# Altium footprint library Molex FFC - FPC Connectors (SMT).PcbLib: 638 footprints (part 38 of 40)
Each footprint in its own frame and in the unit in brackets; x right, y up, seen from the top. Pads: shape width x height; smd on the part's side, far side on the other; paste and mask are expansions set on the pad; w line width, h text height; cw(c..) or ccw(c..) is an arc to the next point about the centre after c.
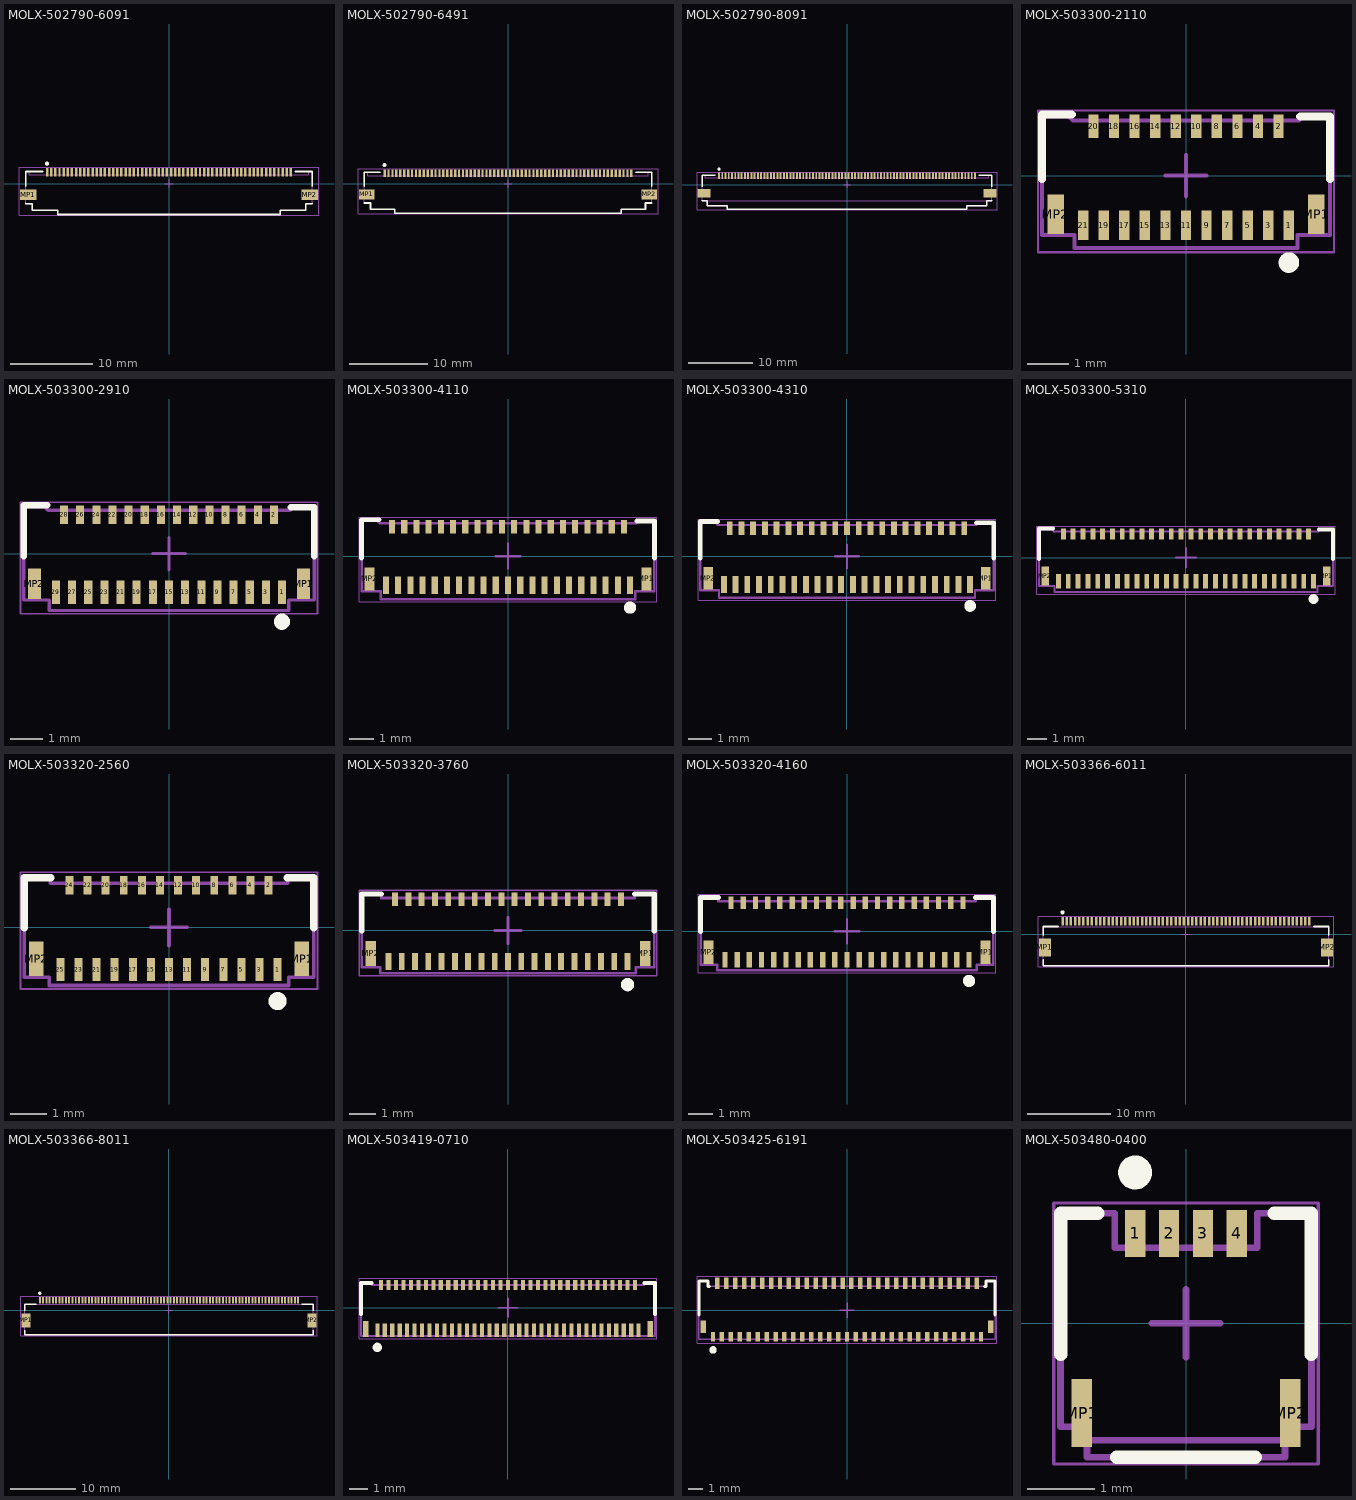
[diagram p37: the footprints below, top view; thin cyan lines are the x and y axes]

## MOLX-502790-6091 [mm] "FPC Connector, 60-Leads, Right Angle, Pitch 0.5 mm, Mated Height 2.5 mm, SMT"
height 2.512
pads (62):
  rect 0.3x1 smd: 1(-14.75,1.35) 2(-14.25,1.35) 3(-13.75,1.35) 4(-13.25,1.35) 5(-12.75,1.35) 6(-12.25,1.35) 7(-11.75,1.35) 8(-11.25,1.35) 9(-10.75,1.35) 10(-10.25,1.35) 11(-9.75,1.35) 12(-9.25,1.35) 13(-8.75,1.35) 14(-8.25,1.35) 15(-7.75,1.35) 16(-7.25,1.35) 17(-6.75,1.35) 18(-6.25,1.35) 19(-5.75,1.35) 20(-5.25,1.35) 21(-4.75,1.35) 22(-4.25,1.35) 23(-3.75,1.35) 24(-3.25,1.35) 25(-2.75,1.35) 26(-2.25,1.35) 27(-1.75,1.35) 28(-1.25,1.35) 29(-0.75,1.35) 30(-0.25,1.35) 31(0.25,1.35) 32(0.75,1.35) 33(1.25,1.35) 34(1.75,1.35) 35(2.25,1.35) 36(2.75,1.35) 37(3.25,1.35) 38(3.75,1.35) 39(4.25,1.35) 40(4.75,1.35) 41(5.25,1.35) 42(5.75,1.35) 43(6.25,1.35) 44(6.75,1.35) 45(7.25,1.35) 46(7.75,1.35) 47(8.25,1.35) 48(8.75,1.35) 49(9.25,1.35) 50(9.75,1.35) 51(10.25,1.35) 52(10.75,1.35) 53(11.25,1.35) 54(11.75,1.35) 55(12.25,1.35) 56(12.75,1.35) 57(13.25,1.35) 58(13.75,1.35) 59(14.25,1.35) 60(14.75,1.35)
  rect 2x1.3 smd: MP1(-17.05,-1.35) MP2(17.05,-1.35)
Top Overlay:
  circle w0.25: c-14.75,2.4 r0.125
  lines w0.2: -17.35,-2.4 -17.35,-2.45 -16.55,-2.45 -16.55,-3.25 -13.45,-3.25 -13.45,-3.75 13.45,-3.75 13.45,-3.25 16.55,-3.25 16.55,-2.45 17.35,-2.45 17.35,-2.4 ; -17.35,-0.3 -17.35,1.45 -15.3,1.45 ; 15.3,1.45 17.35,1.45 17.35,-0.3
Mechanical 13:
  lines w0.1: -17.35,-2.45 -16.55,-2.45 -16.55,-3.25 -13.45,-3.25 -13.45,-3.75 13.45,-3.75 13.45,-3.25 16.55,-3.25 16.55,-2.45 17.35,-2.45 17.35,1.45 16.9,1.45 16.9,1.05 -16.9,1.05 -16.9,1.45 -17.35,1.45 -17.35,-2.45
Mechanical 15:
  lines w0.05: -18.15,-3.85 -18.15,1.95 18.15,1.95 18.15,-3.85 -18.15,-3.85
  lines w0.1: -0.5,0 0.5,0 ; 0,-0.5 0,0.5
3D body: height 0.25, standoff 0, extent -17.75,-3.75 17.75,1.55

## MOLX-502790-6491 [mm] "FPC Connector, 64-Leads, Right Angle, Pitch 0.5 mm, Mated Height 2.5 mm, SMT"
height 2.512
pads (66):
  rect 0.3x1 smd: 1(-15.75,1.35) 2(-15.25,1.35) 3(-14.75,1.35) 4(-14.25,1.35) 5(-13.75,1.35) 6(-13.25,1.35) 7(-12.75,1.35) 8(-12.25,1.35) 9(-11.75,1.35) 10(-11.25,1.35) 11(-10.75,1.35) 12(-10.25,1.35) 13(-9.75,1.35) 14(-9.25,1.35) 15(-8.75,1.35) 16(-8.25,1.35) 17(-7.75,1.35) 18(-7.25,1.35) 19(-6.75,1.35) 20(-6.25,1.35) 21(-5.75,1.35) 22(-5.25,1.35) 23(-4.75,1.35) 24(-4.25,1.35) 25(-3.75,1.35) 26(-3.25,1.35) 27(-2.75,1.35) 28(-2.25,1.35) 29(-1.75,1.35) 30(-1.25,1.35) 31(-0.75,1.35) 32(-0.25,1.35) 33(0.25,1.35) 34(0.75,1.35) 35(1.25,1.35) 36(1.75,1.35) 37(2.25,1.35) 38(2.75,1.35) 39(3.25,1.35) 40(3.75,1.35) 41(4.25,1.35) 42(4.75,1.35) 43(5.25,1.35) 44(5.75,1.35) 45(6.25,1.35) 46(6.75,1.35) 47(7.25,1.35) 48(7.75,1.35) 49(8.25,1.35) 50(8.75,1.35) 51(9.25,1.35) 52(9.75,1.35) 53(10.25,1.35) 54(10.75,1.35) 55(11.25,1.35) 56(11.75,1.35) 57(12.25,1.35) 58(12.75,1.35) 59(13.25,1.35) 60(13.75,1.35) 61(14.25,1.35) 62(14.75,1.35) 63(15.25,1.35) 64(15.75,1.35)
  rect 2x1.3 smd: MP1(-18.05,-1.35) MP2(18.05,-1.35)
Top Overlay:
  circle w0.25: c-15.75,2.4 r0.125
  lines w0.2: -18.35,-2.4 -18.35,-2.45 -17.55,-2.45 -17.55,-3.25 -14.45,-3.25 -14.45,-3.75 14.45,-3.75 14.45,-3.25 17.55,-3.25 17.55,-2.45 18.35,-2.45 18.35,-2.4 ; -18.35,-0.3 -18.35,1.45 -16.3,1.45 ; 16.3,1.45 18.35,1.45 18.35,-0.3
Mechanical 13:
  lines w0.1: -17.9,1.05 -17.9,1.45 -18.35,1.45 -18.35,-2.45 -17.55,-2.45 -17.55,-3.25 -14.45,-3.25 -14.45,-3.75 14.45,-3.75 14.45,-3.25 17.55,-3.25 17.55,-2.45 18.35,-2.45 18.35,1.45 17.9,1.45 17.9,1.05 -17.9,1.05
Mechanical 15:
  lines w0.05: -19.15,-3.85 19.15,-3.85 19.15,1.95 -19.15,1.95 -19.15,-3.85
  lines w0.1: -0.5,0 0.5,0 ; 0,-0.5 0,0.5
3D body: height 0.25, standoff 0, extent -18.75,-3.75 18.75,1.55

## MOLX-502790-8091 [mm] "FPC Connector, 80-Leads, Right Angle, Pitch 0.5 mm, Mated Height 2.5 mm, SMT"
height 2.5
pads (82):
  rect 0.3x1 smd: 1(-19.75,1.35) 2(-19.25,1.35) 3(-18.75,1.35) 4(-18.25,1.35) 5(-17.75,1.35) 6(-17.25,1.35) 7(-16.75,1.35) 8(-16.25,1.35) 9(-15.75,1.35) 10(-15.25,1.35) 11(-14.75,1.35) 12(-14.25,1.35) 13(-13.75,1.35) 14(-13.25,1.35) 15(-12.75,1.35) 16(-12.25,1.35) 17(-11.75,1.35) 18(-11.25,1.35) 19(-10.75,1.35) 20(-10.25,1.35) 21(-9.75,1.35) 22(-9.25,1.35) 23(-8.75,1.35) 24(-8.25,1.35) 25(-7.75,1.35) 26(-7.25,1.35) 27(-6.75,1.35) 28(-6.25,1.35) 29(-5.75,1.35) 30(-5.25,1.35) 31(-4.75,1.35) 32(-4.25,1.35) 33(-3.75,1.35) 34(-3.25,1.35) 35(-2.75,1.35) 36(-2.25,1.35) 37(-1.75,1.35) 38(-1.25,1.35) 39(-0.75,1.35) 40(-0.25,1.35) 41(0.25,1.35) 42(0.75,1.35) 43(1.25,1.35) 44(1.75,1.35) 45(2.25,1.35) 46(2.75,1.35) 47(3.25,1.35) 48(3.75,1.35) 49(4.25,1.35) 50(4.75,1.35) 51(5.25,1.35) 52(5.75,1.35) 53(6.25,1.35) 54(6.75,1.35) 55(7.25,1.35) 56(7.75,1.35) 57(8.25,1.35) 58(8.75,1.35) 59(9.25,1.35) 60(9.75,1.35) 61(10.25,1.35) 62(10.75,1.35) 63(11.25,1.35) 64(11.75,1.35) 65(12.25,1.35) 66(12.75,1.35) 67(13.25,1.35) 68(13.75,1.35) 69(14.25,1.35) 70(14.75,1.35) 71(15.25,1.35) 72(15.75,1.35) 73(16.25,1.35) 74(16.75,1.35) 75(17.25,1.35) 76(17.75,1.35) 77(18.25,1.35) 78(18.75,1.35) 79(19.25,1.35) 80(19.75,1.35)
  rect 2x1.3 smd: MP1(-22.05,-1.35) MP2(22.05,-1.35)
Top Overlay:
  circle w0.25: c-19.75,2.4 r0.125
  lines w0.2: -22.35,-2.4 -22.35,-2.45 -21.55,-2.45 -21.55,-3.25 -18.45,-3.25 -18.45,-3.75 18.45,-3.75 18.45,-3.25 21.55,-3.25 21.55,-2.45 22.35,-2.45 22.35,-2.4 ; -22.35,-0.3 -22.35,1.45 -20.3,1.45 ; 20.3,1.45 22.35,1.45 22.35,-0.3
Mechanical 13:
  lines w0.1: -21.55,-2.45 -21.55,-3.25 -18.45,-3.25 -18.45,-3.75 18.45,-3.75 18.45,-3.25 21.55,-3.25 21.55,-2.45 ; -22.35,-2.45 -22.35,1.45 -21.9,1.45 -21.9,1.05 21.9,1.05 21.9,1.45 22.35,1.45 22.35,-2.45 -22.35,-2.45
Mechanical 15:
  lines w0.05: -23.15,-3.85 23.15,-3.85 23.15,1.95 -23.15,1.95 -23.15,-3.85
  lines w0.1: -0.5,0 0.5,0 ; 0,-0.5 0,0.5
3D body: height 0.25, standoff 0, extent -22.75,-3.75 22.75,1.55

## MOLX-503300-2110 [mm] "FPC Connector, 21-Leads, Right Angle, Pitch 0.25 mm, Mated Height 1.2 mm, SMT"
height 1.212
pads (23):
  rect 0.25x0.72 smd: 1(2.5,-1.202) 3(2,-1.202) 5(1.5,-1.202) 7(1,-1.202) 9(0.5,-1.202) 11(0,-1.202) 13(-0.5,-1.202) 15(-1,-1.202) 17(-1.5,-1.202) 19(-2,-1.202) 21(-2.5,-1.202)
  rect 0.25x0.57 smd: 2(2.25,1.203) 4(1.75,1.203) 6(1.25,1.203) 8(0.75,1.203) 10(0.25,1.203) 12(-0.25,1.203) 14(-0.75,1.203) 16(-1.25,1.203) 18(-1.75,1.203) 20(-2.25,1.203)
  rect 0.4x0.95 smd: MP1(3.17,-0.937) MP2(-3.17,-0.937)
Top Overlay:
  circle w0.25: c2.5,-2.112 r0.125
  lines w0.2: -3.5,-0.084 -3.5,1.488 -2.775,1.488 ; 2.775,1.438 3.5,1.438 3.5,-0.084
Mechanical 13:
  lines w0.1: -3.5,-1.442 -2.71,-1.442 -2.71,-1.762 2.71,-1.762 2.71,-1.442 3.5,-1.442 3.5,1.438 2.85,1.438 2.75,1.338 -2.75,1.338 -2.85,1.438 -3.5,1.438 -3.5,-1.442
Mechanical 15:
  lines w0.05: -3.6,-1.862 3.6,-1.862 3.6,1.587 -3.6,1.587 -3.6,-1.862
  lines w0.1: -0.5,0 0.5,0 ; 0,-0.5 0,0.5
3D body: height 0.25, standoff 0, extent -3.5,-1.762 3.5,1.438

## MOLX-503300-2910 [mm] "FPC Connector, 29-Leads, Right Angle, Pitch 0.25 mm, Mated Height 1.2 mm, SMT"
height 1.212
pads (31):
  rect 0.25x0.72 smd: 1(3.5,-1.202) 3(3,-1.202) 5(2.5,-1.202) 7(2,-1.202) 9(1.5,-1.202) 11(1,-1.202) 13(0.5,-1.202) 15(0,-1.202) 17(-0.5,-1.202) 19(-1,-1.202) 21(-1.5,-1.202) 23(-2,-1.202) 25(-2.5,-1.202) 27(-3,-1.202) 29(-3.5,-1.202)
  rect 0.25x0.57 smd: 2(3.25,1.203) 4(2.75,1.203) 6(2.25,1.203) 8(1.75,1.203) 10(1.25,1.203) 12(0.75,1.203) 14(0.25,1.203) 16(-0.25,1.203) 18(-0.75,1.203) 20(-1.25,1.203) 22(-1.75,1.203) 24(-2.25,1.203) 26(-2.75,1.203) 28(-3.25,1.203)
  rect 0.4x0.95 smd: MP1(4.17,-0.937) MP2(-4.17,-0.937)
Top Overlay:
  circle w0.25: c3.5,-2.112 r0.125
  lines w0.2: -4.5,-0.084 -4.5,1.488 -3.775,1.488 ; 3.775,1.438 4.5,1.438 4.5,-0.084
Mechanical 13:
  lines w0.1: -4.5,-1.442 -3.71,-1.442 -3.71,-1.762 3.71,-1.762 3.71,-1.442 4.5,-1.442 4.5,1.438 3.85,1.438 3.75,1.338 -3.75,1.338 -3.85,1.438 -4.5,1.438 -4.5,-1.442
Mechanical 15:
  lines w0.05: -4.6,-1.862 4.6,-1.862 4.6,1.587 -4.6,1.587 -4.6,-1.862
  lines w0.1: -0.5,0 0.5,0 ; 0,-0.5 0,0.5
3D body: height 0.25, standoff 0, extent -4.5,-1.762 4.5,1.438

## MOLX-503300-4110 [mm] "FPC Connector, 41-Leads, Right Angle, Pitch 0.25 mm, Mated Height 1.2 mm, SMT"
height 1.212
pads (43):
  rect 0.25x0.72 smd: 1(5,-1.202) 3(4.5,-1.202) 5(4,-1.202) 7(3.5,-1.202) 9(3,-1.202) 11(2.5,-1.202) 13(2,-1.202) 15(1.5,-1.202) 17(1,-1.202) 19(0.5,-1.202) 21(0,-1.202) 23(-0.5,-1.202) 25(-1,-1.202) 27(-1.5,-1.202) 29(-2,-1.202) 31(-2.5,-1.202) 33(-3,-1.202) 35(-3.5,-1.202) 37(-4,-1.202) 39(-4.5,-1.202) 41(-5,-1.202)
  rect 0.25x0.57 smd: 2(4.75,1.202) 4(4.25,1.202) 6(3.75,1.202) 8(3.25,1.202) 10(2.75,1.202) 12(2.25,1.202) 14(1.75,1.202) 16(1.25,1.202) 18(0.75,1.202) 20(0.25,1.202) 22(-0.25,1.202) 24(-0.75,1.202) 26(-1.25,1.202) 28(-1.75,1.202) 30(-2.25,1.202) 32(-2.75,1.202) 34(-3.25,1.202) 36(-3.75,1.202) 38(-4.25,1.202) 40(-4.75,1.202)
  rect 0.4x0.95 smd: MP1(5.67,-0.937) MP2(-5.67,-0.937)
Top Overlay:
  circle w0.25: c5,-2.113 r0.125
  lines w0.2: -6,-0.085 -6,1.488 -5.275,1.488 ; 5.275,1.438 6,1.438 6,-0.085
Mechanical 13:
  lines w0.1: -6,-1.442 -5.21,-1.442 -5.21,-1.762 5.21,-1.762 5.21,-1.442 6,-1.442 6,1.438 5.35,1.438 5.25,1.338 -5.25,1.338 -5.35,1.438 -6,1.438 -6,-1.442
Mechanical 15:
  lines w0.05: -6.1,-1.862 6.1,-1.862 6.1,1.587 -6.1,1.587 -6.1,-1.862
  lines w0.1: -0.5,0 0.5,0 ; 0,-0.5 0,0.5
3D body: height 0.25, standoff 0, extent -6,-1.762 6,1.438

## MOLX-503300-4310 [mm] "FPC Connector, 43-Leads, Right Angle, Pitch 0.25 mm, Mated Height 1.2 mm, SMT"
height 1.212
pads (45):
  rect 0.25x0.72 smd: 1(5.25,-1.202) 3(4.75,-1.202) 5(4.25,-1.202) 7(3.75,-1.202) 9(3.25,-1.202) 11(2.75,-1.202) 13(2.25,-1.202) 15(1.75,-1.202) 17(1.25,-1.202) 19(0.75,-1.202) 21(0.25,-1.202) 23(-0.25,-1.202) 25(-0.75,-1.202) 27(-1.25,-1.202) 29(-1.75,-1.202) 31(-2.25,-1.202) 33(-2.75,-1.202) 35(-3.25,-1.202) 37(-3.75,-1.202) 39(-4.25,-1.202) 41(-4.75,-1.202) 43(-5.25,-1.202)
  rect 0.25x0.57 smd: 2(5,1.202) 4(4.5,1.202) 6(4,1.202) 8(3.5,1.202) 10(3,1.202) 12(2.5,1.202) 14(2,1.202) 16(1.5,1.202) 18(1,1.202) 20(0.5,1.202) 22(0,1.202) 24(-0.5,1.202) 26(-1,1.202) 28(-1.5,1.202) 30(-2,1.202) 32(-2.5,1.202) 34(-3,1.202) 36(-3.5,1.202) 38(-4,1.202) 40(-4.5,1.202) 42(-5,1.202)
  rect 0.4x0.95 smd: MP1(5.92,-0.937) MP2(-5.92,-0.937)
Top Overlay:
  circle w0.25: c5.25,-2.113 r0.125
  lines w0.2: -6.25,-0.085 -6.25,1.488 -5.525,1.488 ; 5.525,1.438 6.25,1.438 6.25,-0.085
Mechanical 13:
  lines w0.1: -6.25,-1.442 -5.46,-1.442 -5.46,-1.762 5.46,-1.762 5.46,-1.442 6.25,-1.442 6.25,1.438 5.6,1.438 5.5,1.338 -5.5,1.338 -5.6,1.438 -6.25,1.438 -6.25,-1.442
Mechanical 15:
  lines w0.05: -6.35,-1.862 -6.35,1.587 6.35,1.587 6.35,-1.862 -6.35,-1.862
  lines w0.1: -0.5,0 0.5,0 ; 0,-0.5 0,0.5
3D body: height 0.25, standoff 0, extent -6.25,-1.762 6.25,1.438

## MOLX-503300-5310 [mm] "FPC Connector, 53-Leads, Right Angle, Pitch 0.25 mm, Mated Height 1.2 mm, SMT"
height 1.212
pads (55):
  rect 0.25x0.72 smd: 1(6.5,-1.202) 3(6,-1.202) 5(5.5,-1.202) 7(5,-1.202) 9(4.5,-1.202) 11(4,-1.202) 13(3.5,-1.202) 15(3,-1.202) 17(2.5,-1.202) 19(2,-1.202) 21(1.5,-1.202) 23(1,-1.202) 25(0.5,-1.202) 27(0,-1.202) 29(-0.5,-1.202) 31(-1,-1.202) 33(-1.5,-1.202) 35(-2,-1.202) 37(-2.5,-1.202) 39(-3,-1.202) 41(-3.5,-1.202) 43(-4,-1.202) 45(-4.5,-1.202) 47(-5,-1.202) 49(-5.5,-1.202) 51(-6,-1.202) 53(-6.5,-1.202)
  rect 0.25x0.57 smd: 2(6.25,1.202) 4(5.75,1.202) 6(5.25,1.202) 8(4.75,1.202) 10(4.25,1.202) 12(3.75,1.202) 14(3.25,1.202) 16(2.75,1.202) 18(2.25,1.202) 20(1.75,1.202) 22(1.25,1.202) 24(0.75,1.202) 26(0.25,1.202) 28(-0.25,1.202) 30(-0.75,1.202) 32(-1.25,1.202) 34(-1.75,1.202) 36(-2.25,1.202) 38(-2.75,1.202) 40(-3.25,1.202) 42(-3.75,1.202) 44(-4.25,1.202) 46(-4.75,1.202) 48(-5.25,1.202) 50(-5.75,1.202) 52(-6.25,1.202)
  rect 0.4x0.95 smd: MP1(7.17,-0.937) MP2(-7.17,-0.937)
Top Overlay:
  circle w0.25: c6.5,-2.113 r0.125
  lines w0.2: -7.5,-0.085 -7.5,1.488 -6.775,1.488 ; 6.775,1.438 7.5,1.438 7.5,-0.085
Mechanical 13:
  lines w0.1: -7.5,-1.442 -6.71,-1.442 -6.71,-1.762 6.71,-1.762 6.71,-1.442 7.5,-1.442 7.5,1.438 6.85,1.438 6.75,1.338 -6.75,1.338 -6.85,1.438 -7.5,1.438 -7.5,-1.442
Mechanical 15:
  lines w0.05: -7.6,-1.862 7.6,-1.862 7.6,1.587 -7.6,1.587 -7.6,-1.862
  lines w0.1: -0.5,0 0.5,0 ; 0,-0.5 0,0.5
3D body: height 0.25, standoff 0, extent -7.5,-1.762 7.5,1.438

## MOLX-503320-2560 [mm] "FPC Connector, 25-Leads, Right Angle, Pitch 0.25 mm, Mated Height 1.65 mm, SMT"
height 1.65
pads (27):
  rect 0.22x0.64 smd mask-0.64: 1(3,-1.167) 3(2.5,-1.167) 5(2,-1.167) 7(1.5,-1.167) 9(1,-1.167) 11(0.5,-1.167) 13(0,-1.167) 15(-0.5,-1.167) 17(-1,-1.167) 19(-1.5,-1.167) 21(-2,-1.167) 23(-2.5,-1.167) 25(-3,-1.167)
  rect 0.22x0.51 smd mask-0.51: 2(2.75,1.168) 4(2.25,1.168) 6(1.75,1.168) 8(1.25,1.168) 10(0.75,1.168) 12(0.25,1.168) 14(-0.25,1.168) 16(-0.75,1.168) 18(-1.25,1.168) 20(-1.75,1.168) 22(-2.25,1.168) 24(-2.75,1.168)
  rect 0.4x0.95 smd: MP1(3.67,-0.862) MP2(-3.67,-0.862)
Top Overlay:
  circle w0.25: c3,-2.037 r0.125
  lines w0.2: -4,-0.009 -4,1.373 -3.26,1.373 ; 3.26,1.373 4,1.373 4,-0.009
Top Solder:
  region: 0.125,-0.807 -0.125,-0.807 -0.125,-1.527 0.125,-1.527
  region: -0.125,1.453 -0.375,1.453 -0.375,0.883 -0.125,0.883
  region: 0.625,-0.807 0.375,-0.807 0.375,-1.527 0.625,-1.527
  region: 1.125,-0.807 0.875,-0.807 0.875,-1.527 1.125,-1.527
  region: 1.625,-0.807 1.375,-0.807 1.375,-1.527 1.625,-1.527
  region: 2.125,-0.807 1.875,-0.807 1.875,-1.527 2.125,-1.527
  region: 2.625,-0.807 2.375,-0.807 2.375,-1.527 2.625,-1.527
  region: 3.125,-0.807 2.875,-0.807 2.875,-1.527 3.125,-1.527
  region: -0.375,-0.807 -0.625,-0.807 -0.625,-1.527 -0.375,-1.527
  region: -0.875,-0.807 -1.125,-0.807 -1.125,-1.527 -0.875,-1.527
  region: -1.375,-0.807 -1.625,-0.807 -1.625,-1.527 -1.375,-1.527
  region: -1.875,-0.807 -2.125,-0.807 -2.125,-1.527 -1.875,-1.527
  region: -2.375,-0.807 -2.625,-0.807 -2.625,-1.527 -2.375,-1.527
  region: -2.875,-0.807 -3.125,-0.807 -3.125,-1.527 -2.875,-1.527
  region: 0.375,1.453 0.125,1.453 0.125,0.883 0.375,0.883
  region: 0.875,1.453 0.625,1.453 0.625,0.883 0.875,0.883
  region: 1.375,1.453 1.125,1.453 1.125,0.883 1.375,0.883
  region: 1.875,1.453 1.625,1.453 1.625,0.883 1.875,0.883
  region: 2.375,1.453 2.125,1.453 2.125,0.883 2.375,0.883
  region: 2.875,1.453 2.625,1.453 2.625,0.883 2.875,0.883
  region: -0.625,1.453 -0.875,1.453 -0.875,0.883 -0.625,0.883
  region: -1.125,1.453 -1.375,1.453 -1.375,0.883 -1.125,0.883
  region: -1.625,1.453 -1.875,1.453 -1.875,0.883 -1.625,0.883
  region: -2.125,1.453 -2.375,1.453 -2.375,0.883 -2.125,0.883
  region: -2.625,1.453 -2.875,1.453 -2.875,0.883 -2.625,0.883
Mechanical 13:
  lines w0.1: -4,1.373 -4,-1.377 -3.31,-1.377 -3.31,-1.605 3.31,-1.605 3.31,-1.377 4,-1.377 4,1.36 ; -4,1.373 -3.275,1.373 -3.275,1.223 3.275,1.223 ; 3.275,1.36 3.275,1.223 ; 3.275,1.373 4,1.373 ; 3.275,1.223 3.275,1.223
Mechanical 15:
  lines w0.05: 4.1,-1.705 -4.1,-1.705 -4.1,1.522 4.1,1.522 4.1,-1.693
  lines w0.1: -0.5,0 0.5,0 ; 0,-0.5 0,0.5
3D body: height 0.25, standoff 0, extent -4,-1.605 4,1.373

## MOLX-503320-3760 [mm] "FPC Connector, 37-Leads, Right Angle, Pitch 0.25 mm, Mated Height 1.65 mm, SMT"
height 1.65
pads (39):
  rect 0.22x0.64 smd mask-0.64: 1(4.5,-1.167) 3(4,-1.167) 5(3.5,-1.167) 7(3,-1.167) 9(2.5,-1.167) 11(2,-1.167) 13(1.5,-1.167) 15(1,-1.167) 17(0.5,-1.167) 19(0,-1.167) 21(-0.5,-1.167) 23(-1,-1.167) 25(-1.5,-1.167) 27(-2,-1.167) 29(-2.5,-1.167) 31(-3,-1.167) 33(-3.5,-1.167) 35(-4,-1.167) 37(-4.5,-1.167)
  rect 0.22x0.51 smd mask-0.51: 2(4.25,1.168) 4(3.75,1.168) 6(3.25,1.168) 8(2.75,1.168) 10(2.25,1.168) 12(1.75,1.168) 14(1.25,1.168) 16(0.75,1.168) 18(0.25,1.168) 20(-0.25,1.168) 22(-0.75,1.168) 24(-1.25,1.168) 26(-1.75,1.168) 28(-2.25,1.168) 30(-2.75,1.168) 32(-3.25,1.168) 34(-3.75,1.168) 36(-4.25,1.168)
  rect 0.4x0.95 smd: MP1(5.17,-0.862) MP2(-5.17,-0.862)
Top Overlay:
  circle w0.25: c4.5,-2.037 r0.125
  lines w0.2: -5.5,-0.009 -5.5,1.373 -4.76,1.373 ; 4.76,1.373 5.5,1.373 5.5,-0.009
Top Solder:
  region: -2.125,1.453 -2.375,1.453 -2.375,0.883 -2.125,0.883
  region: -2.625,1.453 -2.875,1.453 -2.875,0.883 -2.625,0.883
  region: -4.125,1.453 -4.375,1.453 -4.375,0.883 -4.125,0.883
  region: -3.625,1.453 -3.875,1.453 -3.875,0.883 -3.625,0.883
  region: -3.125,1.453 -3.375,1.453 -3.375,0.883 -3.125,0.883
  region: -1.625,1.453 -1.875,1.453 -1.875,0.883 -1.625,0.883
  region: -4.375,-0.807 -4.625,-0.807 -4.625,-1.527 -4.375,-1.527
  region: -3.875,-0.807 -4.125,-0.807 -4.125,-1.527 -3.875,-1.527
  region: -3.375,-0.807 -3.625,-0.807 -3.625,-1.527 -3.375,-1.527
  region: -2.875,-0.807 -3.125,-0.807 -3.125,-1.527 -2.875,-1.527
  region: -2.375,-0.807 -2.625,-0.807 -2.625,-1.527 -2.375,-1.527
  region: -1.875,-0.807 -2.125,-0.807 -2.125,-1.527 -1.875,-1.527
  region: -1.375,-0.807 -1.625,-0.807 -1.625,-1.527 -1.375,-1.527
  region: -1.125,1.453 -1.375,1.453 -1.375,0.883 -1.125,0.883
  region: -0.625,1.453 -0.875,1.453 -0.875,0.883 -0.625,0.883
  region: -0.125,1.453 -0.375,1.453 -0.375,0.883 -0.125,0.883
  region: 0.375,1.453 0.125,1.453 0.125,0.883 0.375,0.883
  region: 0.875,1.453 0.625,1.453 0.625,0.883 0.875,0.883
  region: 4.375,1.453 4.125,1.453 4.125,0.883 4.375,0.883
  region: 3.875,1.453 3.625,1.453 3.625,0.883 3.875,0.883
  region: 3.375,1.453 3.125,1.453 3.125,0.883 3.375,0.883
  region: 2.875,1.453 2.625,1.453 2.625,0.883 2.875,0.883
  region: 2.375,1.453 2.125,1.453 2.125,0.883 2.375,0.883
  region: 1.875,1.453 1.625,1.453 1.625,0.883 1.875,0.883
  region: -0.875,-0.807 -1.125,-0.807 -1.125,-1.527 -0.875,-1.527
  region: -0.375,-0.807 -0.625,-0.807 -0.625,-1.527 -0.375,-1.527
  region: 0.125,-0.807 -0.125,-0.807 -0.125,-1.527 0.125,-1.527
  region: 0.625,-0.807 0.375,-0.807 0.375,-1.527 0.625,-1.527
  region: 1.125,-0.807 0.875,-0.807 0.875,-1.527 1.125,-1.527
  region: 1.625,-0.807 1.375,-0.807 1.375,-1.527 1.625,-1.527
  region: 4.625,-0.807 4.375,-0.807 4.375,-1.527 4.625,-1.527
  region: 4.125,-0.807 3.875,-0.807 3.875,-1.527 4.125,-1.527
  region: 3.625,-0.807 3.375,-0.807 3.375,-1.527 3.625,-1.527
  region: 3.125,-0.807 2.875,-0.807 2.875,-1.527 3.125,-1.527
  region: 2.625,-0.807 2.375,-0.807 2.375,-1.527 2.625,-1.527
  region: 1.375,1.453 1.125,1.453 1.125,0.883 1.375,0.883
  region: 2.125,-0.807 1.875,-0.807 1.875,-1.527 2.125,-1.527
Mechanical 13:
  lines w0.1: -5.5,-1.377 -5.5,1.373 -4.775,1.373 -4.775,1.223 4.775,1.223 4.775,1.373 5.5,1.373 5.5,-1.377 4.81,-1.377 4.81,-1.605 -4.81,-1.605 -4.81,-1.377 -5.5,-1.377
Mechanical 15:
  lines w0.05: -5.6,-1.705 -5.6,1.522 5.6,1.522 5.6,-1.705 -5.6,-1.705
  lines w0.1: -0.5,0 0.5,0 ; 0,-0.5 0,0.5
3D body: height 0.25, standoff 0, extent -5.5,-1.605 5.5,1.373

## MOLX-503320-4160 [mm] "FPC Connector, 41-Leads, Right Angle, Pitch 0.25 mm, Mated Height 1.65 mm, SMT"
height 1.65
pads (43):
  rect 0.22x0.64 smd mask-0.64: 1(5,-1.167) 3(4.5,-1.167) 5(4,-1.167) 7(3.5,-1.167) 9(3,-1.167) 11(2.5,-1.167) 13(2,-1.167) 15(1.5,-1.167) 17(1,-1.167) 19(0.5,-1.167) 21(0,-1.167) 23(-0.5,-1.167) 25(-1,-1.167) 27(-1.5,-1.167) 29(-2,-1.167) 31(-2.5,-1.167) 33(-3,-1.167) 35(-3.5,-1.167) 37(-4,-1.167) 39(-4.5,-1.167) 41(-5,-1.167)
  rect 0.22x0.51 smd mask-0.51: 2(4.75,1.168) 4(4.25,1.168) 6(3.75,1.168) 8(3.25,1.168) 10(2.75,1.168) 12(2.25,1.168) 14(1.75,1.168) 16(1.25,1.168) 18(0.75,1.168) 20(0.25,1.168) 22(-0.25,1.168) 24(-0.75,1.168) 26(-1.25,1.168) 28(-1.75,1.168) 30(-2.25,1.168) 32(-2.75,1.168) 34(-3.25,1.168) 36(-3.75,1.168) 38(-4.25,1.168) 40(-4.75,1.168)
  rect 0.4x0.95 smd: MP1(5.67,-0.862) MP2(-5.67,-0.862)
Top Overlay:
  circle w0.25: c5,-2.037 r0.125
  lines w0.2: -6,-0.009 -6,1.373 -5.26,1.373 ; 5.26,1.373 6,1.373 6,-0.009
Top Solder:
  region: 2.625,-0.807 2.375,-0.807 2.375,-1.527 2.625,-1.527
  region: 1.875,1.453 1.625,1.453 1.625,0.883 1.875,0.883
  region: 3.125,-0.807 2.875,-0.807 2.875,-1.527 3.125,-1.527
  region: 3.625,-0.807 3.375,-0.807 3.375,-1.527 3.625,-1.527
  region: 4.125,-0.807 3.875,-0.807 3.875,-1.527 4.125,-1.527
  region: 4.625,-0.807 4.375,-0.807 4.375,-1.527 4.625,-1.527
  region: 5.125,-0.807 4.875,-0.807 4.875,-1.527 5.125,-1.527
  region: 2.125,-0.807 1.875,-0.807 1.875,-1.527 2.125,-1.527
  region: 1.625,-0.807 1.375,-0.807 1.375,-1.527 1.625,-1.527
  region: 1.125,-0.807 0.875,-0.807 0.875,-1.527 1.125,-1.527
  region: 0.625,-0.807 0.375,-0.807 0.375,-1.527 0.625,-1.527
  region: 0.125,-0.807 -0.125,-0.807 -0.125,-1.527 0.125,-1.527
  region: -0.375,-0.807 -0.625,-0.807 -0.625,-1.527 -0.375,-1.527
  region: 2.375,1.453 2.125,1.453 2.125,0.883 2.375,0.883
  region: 2.875,1.453 2.625,1.453 2.625,0.883 2.875,0.883
  region: 3.375,1.453 3.125,1.453 3.125,0.883 3.375,0.883
  region: 3.875,1.453 3.625,1.453 3.625,0.883 3.875,0.883
  region: 4.375,1.453 4.125,1.453 4.125,0.883 4.375,0.883
  region: 4.875,1.453 4.625,1.453 4.625,0.883 4.875,0.883
  region: 1.375,1.453 1.125,1.453 1.125,0.883 1.375,0.883
  region: 0.875,1.453 0.625,1.453 0.625,0.883 0.875,0.883
  region: 0.375,1.453 0.125,1.453 0.125,0.883 0.375,0.883
  region: -0.125,1.453 -0.375,1.453 -0.375,0.883 -0.125,0.883
  region: -0.625,1.453 -0.875,1.453 -0.875,0.883 -0.625,0.883
  region: -0.875,-0.807 -1.125,-0.807 -1.125,-1.527 -0.875,-1.527
  region: -1.375,-0.807 -1.625,-0.807 -1.625,-1.527 -1.375,-1.527
  region: -1.875,-0.807 -2.125,-0.807 -2.125,-1.527 -1.875,-1.527
  region: -2.375,-0.807 -2.625,-0.807 -2.625,-1.527 -2.375,-1.527
  region: -2.875,-0.807 -3.125,-0.807 -3.125,-1.527 -2.875,-1.527
  region: -3.375,-0.807 -3.625,-0.807 -3.625,-1.527 -3.375,-1.527
  region: -3.875,-0.807 -4.125,-0.807 -4.125,-1.527 -3.875,-1.527
  region: -1.125,1.453 -1.375,1.453 -1.375,0.883 -1.125,0.883
  region: -2.625,1.453 -2.875,1.453 -2.875,0.883 -2.625,0.883
  region: -3.125,1.453 -3.375,1.453 -3.375,0.883 -3.125,0.883
  region: -3.625,1.453 -3.875,1.453 -3.875,0.883 -3.625,0.883
  region: -2.125,1.453 -2.375,1.453 -2.375,0.883 -2.125,0.883
  region: -1.625,1.453 -1.875,1.453 -1.875,0.883 -1.625,0.883
  region: -4.375,-0.807 -4.625,-0.807 -4.625,-1.527 -4.375,-1.527
  region: -4.875,-0.807 -5.125,-0.807 -5.125,-1.527 -4.875,-1.527
  region: -4.625,1.453 -4.875,1.453 -4.875,0.883 -4.625,0.883
  region: -4.125,1.453 -4.375,1.453 -4.375,0.883 -4.125,0.883
Mechanical 13:
  lines w0.1: -5.31,-1.605 -5.31,-1.377 -6,-1.377 -6,1.373 -5.275,1.373 -5.275,1.223 5.275,1.223 5.275,1.373 6,1.373 6,-1.377 5.31,-1.377 5.31,-1.605 -5.3,-1.605
Mechanical 15:
  lines w0.05: -6.1,-1.705 6.1,-1.705 6.1,1.522 -6.1,1.522 -6.1,-1.705
  lines w0.1: -0.5,0 0.5,0 ; 0,-0.5 0,0.5
3D body: height 0.25, standoff 0, extent -6,-1.605 6,1.373

## MOLX-503366-6011 [mm] "FPC Connector, 60-Leads, Right Angle, Pitch 0.5 mm, Mated Height 2.0 mm, SMT"
height 2.012
pads (62):
  rect 0.3x1 smd: 1(-14.75,1.563) 2(-14.25,1.563) 3(-13.75,1.563) 4(-13.25,1.563) 5(-12.75,1.563) 6(-12.25,1.563) 7(-11.75,1.563) 8(-11.25,1.563) 9(-10.75,1.563) 10(-10.25,1.563) 11(-9.75,1.563) 12(-9.25,1.563) 13(-8.75,1.563) 14(-8.25,1.563) 15(-7.75,1.563) 16(-7.25,1.563) 17(-6.75,1.563) 18(-6.25,1.563) 19(-5.75,1.563) 20(-5.25,1.563) 21(-4.75,1.563) 22(-4.25,1.563) 23(-3.75,1.563) 24(-3.25,1.563) 25(-2.75,1.563) 26(-2.25,1.563) 27(-1.75,1.563) 28(-1.25,1.563) 29(-0.75,1.563) 30(-0.25,1.563) 31(0.25,1.563) 32(0.75,1.563) 33(1.25,1.563) 34(1.75,1.563) 35(2.25,1.563) 36(2.75,1.563) 37(3.25,1.563) 38(3.75,1.563) 39(4.25,1.563) 40(4.75,1.563) 41(5.25,1.563) 42(5.75,1.563) 43(6.25,1.563) 44(6.75,1.563) 45(7.25,1.563) 46(7.75,1.563) 47(8.25,1.563) 48(8.75,1.563) 49(9.25,1.563) 50(9.75,1.563) 51(10.25,1.563) 52(10.75,1.563) 53(11.25,1.563) 54(11.75,1.563) 55(12.25,1.563) 56(12.75,1.563) 57(13.25,1.563) 58(13.75,1.563) 59(14.25,1.563) 60(14.75,1.563)
  rect 1.4x2.15 smd: MP1(-16.85,-1.562) MP2(16.85,-1.562)
Top Overlay:
  circle w0.25: c-14.75,2.613 r0.125
  lines w0.2: -17.05,-3.037 -17.05,-3.777 17.05,-3.777 17.05,-3.037 ; -17.05,-0.087 -17.05,0.923 -15.275,0.923 ; 15.275,0.923 17.05,0.923 17.05,-0.088
Mechanical 13:
  lines w0.1: -17.05,-3.777 17.05,-3.777 17.05,0.923 -17.05,0.923 -17.05,-3.777
Mechanical 15:
  lines w0.05: -17.65,-3.877 -17.65,2.163 17.65,2.163 17.65,-3.877 -17.65,-3.877
  lines w0.1: -0.5,0 0.5,0 ; 0,-0.5 0,0.5
3D body: height 0.25, standoff 0, extent -17.25,-3.777 17.25,1.823

## MOLX-503366-8011 [mm] "FPC Connector, 80-Leads, Right Angle, Pitch 0.5 mm, Mated Height 2.0 mm, SMT"
height 2.012
pads (82):
  rect 0.3x1 smd: 1(-19.75,1.563) 2(-19.25,1.563) 3(-18.75,1.563) 4(-18.25,1.563) 5(-17.75,1.563) 6(-17.25,1.563) 7(-16.75,1.563) 8(-16.25,1.563) 9(-15.75,1.563) 10(-15.25,1.563) 11(-14.75,1.563) 12(-14.25,1.563) 13(-13.75,1.563) 14(-13.25,1.563) 15(-12.75,1.563) 16(-12.25,1.563) 17(-11.75,1.563) 18(-11.25,1.563) 19(-10.75,1.563) 20(-10.25,1.563) 21(-9.75,1.563) 22(-9.25,1.563) 23(-8.75,1.563) 24(-8.25,1.563) 25(-7.75,1.563) 26(-7.25,1.563) 27(-6.75,1.563) 28(-6.25,1.563) 29(-5.75,1.563) 30(-5.25,1.563) 31(-4.75,1.563) 32(-4.25,1.563) 33(-3.75,1.563) 34(-3.25,1.563) 35(-2.75,1.563) 36(-2.25,1.563) 37(-1.75,1.563) 38(-1.25,1.563) 39(-0.75,1.563) 40(-0.25,1.563) 41(0.25,1.563) 42(0.75,1.563) 43(1.25,1.563) 44(1.75,1.563) 45(2.25,1.563) 46(2.75,1.563) 47(3.25,1.563) 48(3.75,1.563) 49(4.25,1.563) 50(4.75,1.563) 51(5.25,1.563) 52(5.75,1.563) 53(6.25,1.563) 54(6.75,1.563) 55(7.25,1.563) 56(7.75,1.563) 57(8.25,1.563) 58(8.75,1.563) 59(9.25,1.563) 60(9.75,1.563) 61(10.25,1.563) 62(10.75,1.563) 63(11.25,1.563) 64(11.75,1.563) 65(12.25,1.563) 66(12.75,1.563) 67(13.25,1.563) 68(13.75,1.563) 69(14.25,1.563) 70(14.75,1.563) 71(15.25,1.563) 72(15.75,1.563) 73(16.25,1.563) 74(16.75,1.563) 75(17.25,1.563) 76(17.75,1.563) 77(18.25,1.563) 78(18.75,1.563) 79(19.25,1.563) 80(19.75,1.563)
  rect 1.4x2.15 smd: MP1(-21.85,-1.562) MP2(21.85,-1.562)
Top Overlay:
  circle w0.25: c-19.75,2.613 r0.125
  lines w0.2: -22.05,-3.037 -22.05,-3.777 22.05,-3.777 22.05,-3.037 ; -22.05,-0.087 -22.05,0.923 -20.275,0.923 ; 20.275,0.923 22.05,0.923 22.05,-0.088
Mechanical 13:
  lines w0.1: -22.05,-3.777 22.05,-3.777 22.05,0.923 -22.05,0.923 -22.05,-3.777
Mechanical 15:
  lines w0.05: -22.65,-3.877 22.65,-3.877 22.65,2.163 -22.65,2.163 -22.65,-3.877
  lines w0.1: -0.5,0 0.5,0 ; 0,-0.5 0,0.5
3D body: height 0.25, standoff 0, extent -22.25,-3.777 22.25,1.823

## MOLX-503419-0710 [mm] "FPC Connector, 71-Leads, Right Angle, Pitch 0.2 mm, Mated Height 0.9 mm, SMT"
height 0.912
pads (73):
  rect 0.22x0.72 smd: 1(-7,-1.215) 3(-6.6,-1.215) 5(-6.2,-1.215) 7(-5.8,-1.215) 9(-5.4,-1.215) 11(-5,-1.215) 13(-4.6,-1.215) 15(-4.2,-1.215) 17(-3.8,-1.215) 19(-3.4,-1.215) 21(-3,-1.215) 23(-2.6,-1.215) 25(-2.2,-1.215) 27(-1.8,-1.215) 29(-1.4,-1.215) 31(-1,-1.215) 33(-0.6,-1.215) 35(-0.2,-1.215) 37(0.2,-1.215) 39(0.6,-1.215) 41(1,-1.215) 43(1.4,-1.215) 45(1.8,-1.215) 47(2.2,-1.215) 49(2.6,-1.215) 51(3,-1.215) 53(3.4,-1.215) 55(3.8,-1.215) 57(4.2,-1.215) 59(4.6,-1.215) 61(5,-1.215) 63(5.4,-1.215) 65(5.8,-1.215) 67(6.2,-1.215) 69(6.6,-1.215) 71(7,-1.215)
  rect 0.22x0.52 smd: 2(-6.8,1.215) 4(-6.4,1.215) 6(-6,1.215) 8(-5.6,1.215) 10(-5.2,1.215) 12(-4.8,1.215) 14(-4.4,1.215) 16(-4,1.215) 18(-3.6,1.215) 20(-3.2,1.215) 22(-2.8,1.215) 24(-2.4,1.215) 26(-2,1.215) 28(-1.6,1.215) 30(-1.2,1.215) 32(-0.8,1.215) 34(-0.4,1.215) 36(0,1.215) 38(0.4,1.215) 40(0.8,1.215) 42(1.2,1.215) 44(1.6,1.215) 46(2,1.215) 48(2.4,1.215) 50(2.8,1.215) 52(3.2,1.215) 54(3.6,1.215) 56(4,1.215) 58(4.4,1.215) 60(4.8,1.215) 62(5.2,1.215) 64(5.6,1.215) 66(6,1.215) 68(6.4,1.215) 70(6.8,1.215)
  rect 0.3x0.85 smd: MP1(-7.61,-1.15) MP2(7.61,-1.15)
Top Overlay:
  circle w0.25: c-7,-2.125 r0.125
  lines w0.2: -7.875,-0.342 -7.875,1.325 -7.31,1.325 ; 7.31,1.325 7.875,1.325 ; 7.875,-0.342 7.875,1.32
Mechanical 13:
  lines w0.1: -7.875,1.325 -7.301,1.325 -7.3,1.225 7.3,1.225 7.3,1.325 7.875,1.325 7.875,-1.525 -7.874,-1.525 -7.874,1.325
Mechanical 15:
  lines w0.05: -7.974,-1.675 7.975,-1.675 7.975,1.575 -7.974,1.575 -7.974,-1.675
  lines w0.1: -0.5,0 0.5,0 ; 0,-0.5 0,0.5
3D body: height 0.25, standoff 0, extent -7.875,-1.525 7.875,1.325

## MOLX-503425-6191 [mm] "FPC Connector, 61-Leads, Right Angle, Pitch 0.3 mm, Mated Height 0.9 mm, SMT"
height 2
pads (63):
  rect 0.3x0.65 smd: 1(-9,-1.8) 3(-8.4,-1.8) 5(-7.8,-1.8) 7(-7.2,-1.8) 9(-6.6,-1.8) 11(-6,-1.8) 13(-5.4,-1.8) 15(-4.8,-1.8) 17(-4.2,-1.8) 19(-3.6,-1.8) 21(-3,-1.8) 23(-2.4,-1.8) 25(-1.8,-1.8) 27(-1.2,-1.8) 29(-0.6,-1.8) 31(0,-1.8) 33(0.6,-1.8) 35(1.2,-1.8) 37(1.8,-1.8) 39(2.4,-1.8) 41(3,-1.8) 43(3.6,-1.8) 45(4.2,-1.8) 47(4.8,-1.8) 49(5.4,-1.8) 51(6,-1.8) 53(6.6,-1.8) 55(7.2,-1.8) 57(7.8,-1.8) 59(8.4,-1.8) 61(9,-1.8)
  rect 0.3x0.75 smd: 2(-8.7,1.8) 4(-8.1,1.8) 6(-7.5,1.8) 8(-6.9,1.8) 10(-6.3,1.8) 12(-5.7,1.8) 14(-5.1,1.8) 16(-4.5,1.8) 18(-3.9,1.8) 20(-3.3,1.8) 22(-2.7,1.8) 24(-2.1,1.8) 26(-1.5,1.8) 28(-0.9,1.8) 30(-0.3,1.8) 32(0.3,1.8) 34(0.9,1.8) 36(1.5,1.8) 38(2.1,1.8) 40(2.7,1.8) 42(3.3,1.8) 44(3.9,1.8) 46(4.5,1.8) 48(5.1,1.8) 50(5.7,1.8) 52(6.3,1.8) 54(6.9,1.8) 56(7.5,1.8) 58(8.1,1.8) 60(8.7,1.8)
  rect 0.35x0.85 smd: MP1(-9.65,-1.13) MP2(9.65,-1.13)
Top Overlay:
  circle w0.25: c-9,-2.675 r0.125
  lines w0.2: -9.95,-0.325 -9.95,1.95 ; -9.95,1.95 -9.35,1.95 -9.35,1.6 -9.25,1.6 ; 9.25,1.6 9.35,1.6 9.35,1.95 9.95,1.95 ; 9.95,-0.325 9.95,1.95
Mechanical 13:
  lines w0.1: -9.95,-1.95 -9.95,1.95 -9.35,1.95 -9.35,1.6 9.35,1.6 9.35,1.95 9.95,1.95 9.95,-1.95 -9.95,-1.95
Mechanical 15:
  lines w0.05: -10.05,-2.225 10.05,-2.225 10.05,2.275 -10.05,2.275 -10.05,-2.225
  lines w0.1: -0.5,0 0.5,0 ; 0,-0.5 0,0.5
3D body: height 0.25, standoff 0, extent -9.95,-2.05 9.95,1.95

## MOLX-503480-0400 [mm] "FPC Connector, 4-Leads, Right Angle, Pitch 0.5 mm, Mated Height 1.0 mm, SMT"
height 1.907
pads (6):
  rect 0.3x0.7 smd: 1(-0.75,1.325) 2(-0.25,1.325) 3(0.25,1.325) 4(0.75,1.325)
  rect 0.3x1 smd: MP1(-1.54,-1.325) MP2(1.54,-1.325)
Top Overlay:
  circle w0.25: c-0.75,2.225 r0.125
  lines w0.2: -1.85,-0.458 -1.85,1.625 ; -1.85,1.625 -1.3,1.625 ; -1.019,-1.975 1.019,-1.975 ; 1.3,1.625 1.85,1.625 ; 1.85,-0.458 1.85,1.625
Mechanical 13:
  lines w0.1: -1.46,-1.725 1.441,-1.725 ; 1.85,1.625 1.05,1.625 1.05,1.115 -1.05,1.115 -1.05,1.625 -1.85,1.625 -1.85,-1.525 -1.46,-1.525 -1.46,-1.975 1.46,-1.975 1.46,-1.525 1.85,-1.525 1.85,1.625
Mechanical 15:
  lines w0.05: -1.95,-2.075 1.95,-2.075 1.95,1.775 -1.95,1.775 -1.95,-2.075
  lines w0.1: -0.5,0 0.5,0 ; 0,-0.5 0,0.5
3D body: height 0.25, standoff 0, extent -1.85,-1.975 1.85,1.625